# Altium footprint library 6-Connectors-5.PcbLib: 46 footprints (part 1 of 5) (continued)
## 3M_N3408-6202RB [mm] "3M, 3000 Series, 16 Contacts - Pitch 2.54mm - Straight Four-Wall Header (Black) With Short Roll Pin Latch/Ejectors" (continued)
  text "16" at 10.125,1.727 h1.02
  text "1" at -11.227,-2.921 h1.02
3D body "3M_N3408-6202RB.stp": height 24.64, standoff -3.94, extent -19.812,-4.318 19.812,4.318

## 3M_N3408-6302RB [mm] "3M, 3000 Series, 16 Contacts - Pitch 2.54mm - Straight Four-Wall Header (Black) With Long Roll Pin Latch/Ejectors"
height 27.2
pads (18):
  round 1.6 hole 0.9: 1(-8.89,-1.27) 2(-8.89,1.27) 3(-6.35,-1.27) 4(-6.35,1.27) 5(-3.81,-1.27) 6(-3.81,1.27) 7(-1.27,-1.27) 8(-1.27,1.27) 9(1.27,-1.27) 10(1.27,1.27) 11(3.81,-1.27) 12(3.81,1.27) 13(6.35,-1.27) 14(6.35,1.27) 15(8.89,-1.27) 16(8.89,1.27)
  round 4.6 hole 2.8: MTG1(-17.83,-0.254) MTG2(17.83,-0.254)
Top Overlay:
  lines w0.2: -19.812,-2 -19.812,-4.318 19.812,-4.318 19.812,-2 ; -19.812,1.7 -19.812,4.3 ; -19.812,4.318 19.812,4.318 ; -2.032,-4.318 -2.032,-3.175 ; 2.032,-4.318 2.032,-3.175 ; 19.812,1.7 19.812,4.3 ; -12.827,-3.175 12.827,-3.175 12.827,3.175 -12.827,3.175 -12.827,-3.175 ; -10.16,-3.175 -7.62,-3.175 -8.89,-4.318 -10.16,-3.175
  text "16" at 10.125,1.727 h1.02
  text "1" at -11.227,-2.921 h1.02
Mechanical 8:
  lines w0.1: -18.83,-0.254 -17.83,-0.254 ; -17.83,-1.254 -17.83,-0.254 ; -17.83,0.746 -17.83,-0.254 ; -16.83,-0.254 -17.83,-0.254 ; -9.89,-1.27 -8.89,-1.27 ; -9.89,1.27 -8.89,1.27 ; -8.89,-2.27 -8.89,-1.27 ; -8.89,-0.27 -8.89,-1.27 ; -8.89,0.27 -8.89,1.27 ; -8.89,2.27 -8.89,1.27 ; -7.89,-1.27 -8.89,-1.27 ; -7.89,1.27 -8.89,1.27 ; -7.35,-1.27 -6.35,-1.27 ; -7.35,1.27 -6.35,1.27 ; -6.35,-2.27 -6.35,-1.27 ; -6.35,-0.27 -6.35,-1.27 ; -6.35,0.27 -6.35,1.27 ; -6.35,2.27 -6.35,1.27 ; -5.35,-1.27 -6.35,-1.27 ; -5.35,1.27 -6.35,1.27 ; -4.81,-1.27 -3.81,-1.27 ; -4.81,1.27 -3.81,1.27 ; -3.81,-2.27 -3.81,-1.27 ; -3.81,-0.27 -3.81,-1.27 ; -3.81,0.27 -3.81,1.27 ; -3.81,2.27 -3.81,1.27 ; -2.81,-1.27 -3.81,-1.27 ; -2.81,1.27 -3.81,1.27 ; -2.27,-1.27 -1.27,-1.27 ; -2.27,1.27 -1.27,1.27 ; -1.27,-2.27 -1.27,-1.27 ; -1.27,-0.27 -1.27,-1.27 ; -1.27,0.27 -1.27,1.27 ; -1.27,2.27 -1.27,1.27 ; -1,0 0,0 ; -0.27,-1.27 -1.27,-1.27 ; -0.27,1.27 -1.27,1.27 ; 0,-1 0,0 ; 0,1 0,0 ; 0.27,-1.27 1.27,-1.27 ; 0.27,1.27 1.27,1.27 ; 1,0 0,0 ; 1.27,-2.27 1.27,-1.27 ; 1.27,-0.27 1.27,-1.27 ; 1.27,0.27 1.27,1.27 ; 1.27,2.27 1.27,1.27 ; 2.27,-1.27 1.27,-1.27 ; 2.27,1.27 1.27,1.27 ; 2.81,-1.27 3.81,-1.27 ; 2.81,1.27 3.81,1.27 ; 3.81,-2.27 3.81,-1.27 ; 3.81,-0.27 3.81,-1.27 ; 3.81,0.27 3.81,1.27 ; 3.81,2.27 3.81,1.27 ; 4.81,-1.27 3.81,-1.27 ; 4.81,1.27 3.81,1.27 ; 5.35,-1.27 6.35,-1.27 ; 5.35,1.27 6.35,1.27 ; 6.35,-2.27 6.35,-1.27 ; 6.35,-0.27 6.35,-1.27 ; 6.35,0.27 6.35,1.27 ; 6.35,2.27 6.35,1.27 ; 7.35,-1.27 6.35,-1.27 ; 7.35,1.27 6.35,1.27 ; 7.89,-1.27 8.89,-1.27 ; 7.89,1.27 8.89,1.27 ; 8.89,-2.27 8.89,-1.27 ; 8.89,-0.27 8.89,-1.27 ; 8.89,0.27 8.89,1.27 ; 8.89,2.27 8.89,1.27 ; 9.89,-1.27 8.89,-1.27 ; 9.89,1.27 8.89,1.27 ; 16.844,-0.254 17.844,-0.254 ; 17.844,-1.254 17.844,-0.254 ; 17.844,0.746 17.844,-0.254 ; 18.844,-0.254 17.844,-0.254
Mechanical 14:
  circle w0.1: c17.844,-0.254 r1.27
  circle w0.1: c-17.844,-0.254 r1.27
  lines w0.1: -19.812,-3.175 -16.484,-3.175 ; -16.484,-4.318 -16.484,-1.727 -9.525,-1.727 -9.525,1.27 -16.484,1.27 -16.484,4.318 ; -15.642,-4.318 -15.642,-1.727 ; -15.642,1.27 -15.642,4.318 ; -13.209,-4.318 -13.208,-1.727 ; -12.827,-1.727 -12.827,-3.175 12.827,-3.175 12.827,-1.727 ; -12.827,1.27 -12.827,3.175 12.827,3.175 12.827,1.27 ; -6.039,-4.318 -6.039,-3.175 ; -4.121,-4.318 -4.121,-3.175 ; -2.032,-4.318 -2.032,-3.175 ; 2.032,-4.318 2.032,-3.175 ; 6.661,-4.318 6.661,-3.175 ; 8.579,-4.318 8.579,-3.175 ; 12.366,-4.318 12.366,-3.175 ; 12.366,3.175 12.366,4.318 ; 13.208,1.27 13.208,4.318 ; 13.249,-4.318 13.249,-1.727 ; 15.642,-4.318 15.642,-1.727 ; 15.642,1.27 15.642,4.318 ; 16.484,-4.318 16.484,-1.727 9.525,-1.727 9.525,1.27 16.484,1.27 16.484,4.318 ; 16.484,-3.175 19.812,-3.175 ; 16.484,3.175 19.812,3.175 ; -19.812,-4.318 -19.812,4.318 19.812,4.318 19.812,-4.318 -19.812,-4.318 ; -19.812,3.175 -16.484,3.175 -19.812,3.175 ; -19.368,-1.134 -17.844,-2.014 -16.32,-1.134 -16.32,0.626 -17.844,1.506 -19.368,0.626 -19.368,-1.134 ; -13.208,1.27 -13.208,4.318 -13.208,1.27 ; -12.366,-4.318 -12.366,-3.175 -12.366,-4.318 ; -12.366,3.175 -12.366,4.318 -12.366,3.175 ; 16.32,-1.134 17.844,-2.014 19.368,-1.134 19.368,0.626 17.844,1.506 16.32,0.626 16.32,-1.134
  text "16" at 10.125,1.727 h1.02
  text "1" at -11.227,-2.921 h1.02
3D body "3M_N3408-6302RB.stp": height 27.18, standoff -3.94, extent -19.812,-4.318 19.812,4.318

## 3M_N3428-6202RB [mm] "3M, 3000 Series, 20 Contacts - Pitch 2.54mm - Straight Four-Wall Header (Black) With Short Roll Pin Latch/Ejectors"
height 24.6
pads (22):
  round 1.6 hole 0.9: 1(-11.43,-1.27) 2(-11.43,1.27) 3(-8.89,-1.27) 4(-8.89,1.27) 5(-6.35,-1.27) 6(-6.35,1.27) 7(-3.81,-1.27) 8(-3.81,1.27) 9(-1.27,-1.27) 10(-1.27,1.27) 11(1.27,-1.27) 12(1.27,1.27) 13(3.81,-1.27) 14(3.81,1.27) 15(6.35,-1.27) 16(6.35,1.27) 17(8.89,-1.27) 18(8.89,1.27) 19(11.43,-1.27) 20(11.43,1.27)
  round 4.6 hole 2.8: MTG1(-20.384,-0.254) MTG2(20.384,-0.254)
Top Overlay:
  lines w0.2: -22.352,-2 -22.352,-4.318 22.352,-4.318 22.352,-2 ; -22.352,1.7 -22.352,4.3 ; -22.352,4.318 22.352,4.318 ; -12.7,-3.175 -11.43,-4.318 -10.16,-3.175 ; -2.032,-4.318 -2.032,-3.175 ; 2.032,-4.318 2.032,-3.175 ; 22.352,1.7 22.352,4.3 ; -15.367,-3.175 15.367,-3.175 15.367,3.175 -15.367,3.175 -15.367,-3.175
  text "20" at 12.665,1.727 h1.02
  text "1" at -13.767,-2.871 h1.02
Mechanical 14:
  circle w0.1: c-20.384,-0.254 r1.27
  circle w0.1: c20.384,-0.254 r1.27
  lines w0.1: -22.352,-3.175 -19.024,-3.175 ; -21.384,-0.254 -20.384,-0.254 ; -20.384,-1.254 -20.384,-0.254 ; -20.384,0.746 -20.384,-0.254 ; -19.384,-0.254 -20.384,-0.254 ; -19.024,-4.318 -19.024,-1.727 -12.065,-1.727 -12.065,1.27 -19.024,1.27 -19.024,4.318 ; -18.182,-4.318 -18.182,-1.727 ; -18.182,1.27 -18.182,4.318 ; -15.749,-4.318 -15.748,-1.727 ; -15.367,-1.727 -15.367,-3.175 15.367,-3.175 15.367,-1.727 ; -15.367,1.27 -15.367,3.175 15.367,3.175 15.367,1.27 ; -2.032,-4.318 -2.032,-3.175 ; 2.032,-4.318 2.032,-3.175 ; 14.906,-4.318 14.906,-3.175 ; 14.906,3.175 14.906,4.318 ; 15.748,1.27 15.748,4.318 ; 15.789,-4.318 15.789,-1.727 ; 18.182,-4.318 18.182,-1.727 ; 18.182,1.27 18.182,4.318 ; 19.024,-4.318 19.024,-1.727 12.065,-1.727 12.065,1.27 19.024,1.27 19.024,4.318 ; 19.024,-3.175 22.352,-3.175 ; 19.024,3.175 22.352,3.175 ; 19.384,-0.254 20.384,-0.254 ; 20.384,-1.254 20.384,-0.254 ; 20.384,0.746 20.384,-0.254 ; 21.384,-0.254 20.384,-0.254 ; -22.352,-4.318 22.352,-4.318 22.352,4.318 -22.352,4.318 -22.352,-4.318 ; -22.352,3.175 -19.024,3.175 -22.352,3.175 ; -21.908,-1.134 -21.908,0.626 -20.384,1.506 -18.86,0.626 -18.86,-1.134 -20.384,-2.014 -21.908,-1.134 ; -15.748,1.27 -15.748,4.318 -15.748,1.27 ; -14.906,-4.318 -14.906,-3.175 -14.906,-4.318 ; -14.906,3.175 -14.906,4.318 -14.906,3.175 ; -12.7,-3.175 -11.43,-4.318 -10.16,-3.175 -12.7,-3.175 ; 18.86,-1.134 18.86,0.626 20.384,1.506 21.908,0.626 21.908,-1.134 20.384,-2.014 18.86,-1.134
  text "1" at -13.767,-2.871 h1.02
  text "20" at 12.665,1.727 h1.02
3D body "3M_N3428-6202RB.stp": height 24.64, standoff -3.94, extent -22.352,-4.318 22.352,4.318

## 3M_N3429-6002RB [mm] "3M, 3000 Series, 26 Contacts - Pitch 2.54mm - Straight Four-Wall Header (Black) Without Roll Pin Latch/Ejectors"
height 24.6
pads (28):
  round 1.6 hole 0.9: 1(-15.24,-1.27) 2(-15.24,1.27) 3(-12.7,-1.27) 4(-12.7,1.27) 5(-10.16,-1.27) 6(-10.16,1.27) 7(-7.62,-1.27) 8(-7.62,1.27) 9(-5.08,-1.27) 10(-5.08,1.27) 11(-2.54,-1.27) 12(-2.54,1.27) 13(0,-1.27) 14(0,1.27) 15(2.54,-1.27) 16(2.54,1.27) 17(5.08,-1.27) 18(5.08,1.27) 19(7.62,-1.27) 20(7.62,1.27) 21(10.16,-1.27) 22(10.16,1.27) 23(12.7,-1.27) 24(12.7,1.27) 25(15.24,-1.27) 26(15.24,1.27)
  round 4.6 hole 2.8: MTG1(-24.18,-0.25) MTG2(24.18,-0.25)
Top Overlay:
  lines w0.2: -26.162,-2 -26.162,-4.318 26.162,-4.318 26.162,-2 ; -26.162,1.7 -26.162,4.3 ; -26.162,4.318 26.162,4.318 ; -2.032,-4.318 -2.032,-3.175 ; 2.032,-4.318 2.032,-3.175 ; 26.162,1.7 26.162,4.3 ; -19.177,-3.175 -19.177,3.175 19.177,3.175 19.177,-3.175 -19.177,-3.175 ; -16.51,-3.175 -15.24,-4.318 -13.97,-3.175 -16.51,-3.175
  text "1" at -17.577,-2.921 h1.02
  text "26" at 16.475,1.727 h1.02
Mechanical 8:
  lines w0.1: -24.68,-0.25 -24.18,-0.25 ; -24.18,-0.75 -24.18,-0.25 ; -24.18,0.25 -24.18,-0.25 ; -23.68,-0.25 -24.18,-0.25 ; -15.74,-1.27 -15.24,-1.27 ; -15.74,1.27 -15.24,1.27 ; -15.24,-1.77 -15.24,-1.27 ; -15.24,-0.77 -15.24,-1.27 ; -15.24,0.77 -15.24,1.27 ; -15.24,1.77 -15.24,1.27 ; -14.74,-1.27 -15.24,-1.27 ; -14.74,1.27 -15.24,1.27 ; -13.2,-1.27 -12.7,-1.27 ; -13.2,1.27 -12.7,1.27 ; -12.7,-1.77 -12.7,-1.27 ; -12.7,-0.77 -12.7,-1.27 ; -12.7,0.77 -12.7,1.27 ; -12.7,1.77 -12.7,1.27 ; -12.2,-1.27 -12.7,-1.27 ; -12.2,1.27 -12.7,1.27 ; -10.66,-1.27 -10.16,-1.27 ; -10.66,1.27 -10.16,1.27 ; -10.16,-1.77 -10.16,-1.27 ; -10.16,-0.77 -10.16,-1.27 ; -10.16,0.77 -10.16,1.27 ; -10.16,1.77 -10.16,1.27 ; -9.66,-1.27 -10.16,-1.27 ; -9.66,1.27 -10.16,1.27 ; -8.12,-1.27 -7.62,-1.27 ; -8.12,1.27 -7.62,1.27 ; -7.62,-1.77 -7.62,-1.27 ; -7.62,-0.77 -7.62,-1.27 ; -7.62,0.77 -7.62,1.27 ; -7.62,1.77 -7.62,1.27 ; -7.12,-1.27 -7.62,-1.27 ; -7.12,1.27 -7.62,1.27 ; -5.58,-1.27 -5.08,-1.27 ; -5.58,1.27 -5.08,1.27 ; -5.08,-1.77 -5.08,-1.27 ; -5.08,-0.77 -5.08,-1.27 ; -5.08,0.77 -5.08,1.27 ; -5.08,1.77 -5.08,1.27 ; -4.58,-1.27 -5.08,-1.27 ; -4.58,1.27 -5.08,1.27 ; -3.04,-1.27 -2.54,-1.27 ; -3.04,1.27 -2.54,1.27 ; -2.54,-1.77 -2.54,-1.27 ; -2.54,-0.77 -2.54,-1.27 ; -2.54,0.77 -2.54,1.27 ; -2.54,1.77 -2.54,1.27 ; -2.04,-1.27 -2.54,-1.27 ; -2.04,1.27 -2.54,1.27 ; -0.5,-1.27 0,-1.27 ; -0.5,0 0,0 ; -0.5,1.27 0,1.27 ; 0,-1.77 0,-1.27 ; 0,-0.77 0,-1.27 ; 0,-0.5 0,0 ; 0,0.5 0,0 ; 0,0.77 0,1.27 ; 0,1.77 0,1.27 ; 0.5,-1.27 0,-1.27 ; 0.5,0 0,0 ; 0.5,1.27 0,1.27 ; 2.04,-1.27 2.54,-1.27 ; 2.04,1.27 2.54,1.27 ; 2.54,-1.77 2.54,-1.27 ; 2.54,-0.77 2.54,-1.27 ; 2.54,0.77 2.54,1.27 ; 2.54,1.77 2.54,1.27 ; 3.04,-1.27 2.54,-1.27 ; 3.04,1.27 2.54,1.27 ; 4.58,-1.27 5.08,-1.27 ; 4.58,1.27 5.08,1.27 ; 5.08,-1.77 5.08,-1.27 ; 5.08,-0.77 5.08,-1.27 ; 5.08,0.77 5.08,1.27 ; 5.08,1.77 5.08,1.27 ; 5.58,-1.27 5.08,-1.27 ; 5.58,1.27 5.08,1.27 ; 7.12,-1.27 7.62,-1.27 ; 7.12,1.27 7.62,1.27 ; 7.62,-1.77 7.62,-1.27 ; 7.62,-0.77 7.62,-1.27 ; 7.62,0.77 7.62,1.27 ; 7.62,1.77 7.62,1.27 ; 8.12,-1.27 7.62,-1.27 ; 8.12,1.27 7.62,1.27 ; 9.66,-1.27 10.16,-1.27 ; 9.66,1.27 10.16,1.27 ; 10.16,-1.77 10.16,-1.27 ; 10.16,-0.77 10.16,-1.27 ; 10.16,0.77 10.16,1.27 ; 10.16,1.77 10.16,1.27 ; 10.66,-1.27 10.16,-1.27 ; 10.66,1.27 10.16,1.27 ; 12.2,-1.27 12.7,-1.27 ; 12.2,1.27 12.7,1.27 ; 12.7,-1.77 12.7,-1.27 ; 12.7,-0.77 12.7,-1.27 ; 12.7,0.77 12.7,1.27 ; 12.7,1.77 12.7,1.27 ; 13.2,-1.27 12.7,-1.27 ; 13.2,1.27 12.7,1.27 ; 14.74,-1.27 15.24,-1.27 ; 14.74,1.27 15.24,1.27 ; 15.24,-1.77 15.24,-1.27 ; 15.24,-0.77 15.24,-1.27 ; 15.24,0.77 15.24,1.27 ; 15.24,1.77 15.24,1.27 ; 15.74,-1.27 15.24,-1.27 ; 15.74,1.27 15.24,1.27 ; 23.68,-0.25 24.18,-0.25 ; 24.18,-0.75 24.18,-0.25 ; 24.18,0.25 24.18,-0.25 ; 24.68,-0.25 24.18,-0.25
Mechanical 14:
  circle w0.1: c-24.194,-0.254 r1.27
  circle w0.1: c24.194,-0.254 r1.27
  lines w0.1: -26.162,-3.175 -22.834,-3.175 ; -22.834,-4.318 -22.834,-1.727 -15.875,-1.727 -15.875,1.27 -22.834,1.27 -22.834,4.318 ; -21.992,-4.318 -21.992,-1.727 ; -21.992,1.27 -21.992,4.318 ; -19.559,-4.318 -19.558,-1.727 ; -19.177,-1.727 -19.177,-3.175 19.177,-3.175 19.177,-1.727 ; -19.177,1.27 -19.177,3.175 19.177,3.175 19.177,1.27 ; -12.389,-4.318 -12.389,-3.175 ; -10.471,-4.318 -10.471,-3.175 ; 18.716,-4.318 18.716,-3.175 ; 18.716,3.175 18.716,4.318 ; 19.558,1.27 19.558,4.318 ; 19.599,-4.318 19.599,-1.727 ; 21.992,-4.318 21.992,-1.727 ; 21.992,1.27 21.992,4.318 ; 22.834,-4.318 22.834,-1.727 15.875,-1.727 15.875,1.27 22.834,1.27 22.834,4.318 ; 22.834,-3.175 26.162,-3.175 ; 22.834,3.175 26.162,3.175 ; -26.162,-4.318 26.162,-4.318 26.162,4.318 -26.162,4.318 -26.162,-4.318 ; -26.162,3.175 -22.834,3.175 -26.162,3.175 ; -25.718,-1.134 -25.718,0.626 -24.194,1.506 -22.67,0.626 -22.67,-1.134 -24.194,-2.014 -25.718,-1.134 ; -19.558,1.27 -19.558,4.318 -19.558,1.27 ; -18.716,-4.318 -18.716,-3.175 -18.716,-4.318 ; -18.716,3.175 -18.716,4.318 -18.716,3.175 ; -16.51,-3.175 -15.24,-4.318 -13.97,-3.175 -16.51,-3.175 ; 22.67,-1.134 22.67,0.626 24.194,1.506 25.718,0.626 25.718,-1.134 24.194,-2.014 22.67,-1.134
  text "1" at -17.577,-2.921 h1.02
  text "26" at 16.475,1.727 h1.02
3D body "3M_N3429-6002RB.stp": height 17.27, standoff -3.94, extent -26.162,-4.318 26.162,4.318

## 3M_N3429-6202RB [mm] "3M, 3000 Series, 26 Contacts - Pitch 2.54mm - Straight Four-Wall Header (Black) With Short Roll Pin Latch/Ejectors"
height 24.6
pads (28):
  round 1.6 hole 0.9: 1(-15.24,-1.27) 2(-15.24,1.27) 3(-12.7,-1.27) 4(-12.7,1.27) 5(-10.16,-1.27) 6(-10.16,1.27) 7(-7.62,-1.27) 8(-7.62,1.27) 9(-5.08,-1.27) 10(-5.08,1.27) 11(-2.54,-1.27) 12(-2.54,1.27) 13(0,-1.27) 14(0,1.27) 15(2.54,-1.27) 16(2.54,1.27) 17(5.08,-1.27) 18(5.08,1.27) 19(7.62,-1.27) 20(7.62,1.27) 21(10.16,-1.27) 22(10.16,1.27) 23(12.7,-1.27) 24(12.7,1.27) 25(15.24,-1.27) 26(15.24,1.27)
  round 4.6 hole 2.8: MTG1(-24.18,-0.25) MTG2(24.18,-0.25)
Top Overlay:
  lines w0.2: -26.162,-2 -26.162,-4.318 26.162,-4.318 26.162,-2 ; -26.162,1.7 -26.162,4.3 ; -26.162,4.318 26.162,4.318 ; -2.032,-4.318 -2.032,-3.175 ; 2.032,-4.318 2.032,-3.175 ; 26.162,1.7 26.162,4.3 ; -19.177,-3.175 19.177,-3.175 19.177,3.175 -19.177,3.175 -19.177,-3.175 ; -16.51,-3.175 -13.97,-3.175 -15.24,-4.318 -16.51,-3.175
  text "26" at 16.475,1.727 h1.02
  text "1" at -17.577,-2.921 h1.02
Mechanical 8:
  lines w0.1: -24.68,-0.25 -24.18,-0.25 ; -24.18,-0.75 -24.18,-0.25 ; -24.18,0.25 -24.18,-0.25 ; -23.68,-0.25 -24.18,-0.25 ; -15.74,-1.27 -15.24,-1.27 ; -15.74,1.27 -15.24,1.27 ; -15.24,-1.77 -15.24,-1.27 ; -15.24,-0.77 -15.24,-1.27 ; -15.24,0.77 -15.24,1.27 ; -15.24,1.77 -15.24,1.27 ; -14.74,-1.27 -15.24,-1.27 ; -14.74,1.27 -15.24,1.27 ; -13.2,-1.27 -12.7,-1.27 ; -13.2,1.27 -12.7,1.27 ; -12.7,-1.77 -12.7,-1.27 ; -12.7,-0.77 -12.7,-1.27 ; -12.7,0.77 -12.7,1.27 ; -12.7,1.77 -12.7,1.27 ; -12.2,-1.27 -12.7,-1.27 ; -12.2,1.27 -12.7,1.27 ; -10.66,-1.27 -10.16,-1.27 ; -10.66,1.27 -10.16,1.27 ; -10.16,-1.77 -10.16,-1.27 ; -10.16,-0.77 -10.16,-1.27 ; -10.16,0.77 -10.16,1.27 ; -10.16,1.77 -10.16,1.27 ; -9.66,-1.27 -10.16,-1.27 ; -9.66,1.27 -10.16,1.27 ; -8.12,-1.27 -7.62,-1.27 ; -8.12,1.27 -7.62,1.27 ; -7.62,-1.77 -7.62,-1.27 ; -7.62,-0.77 -7.62,-1.27 ; -7.62,0.77 -7.62,1.27 ; -7.62,1.77 -7.62,1.27 ; -7.12,-1.27 -7.62,-1.27 ; -7.12,1.27 -7.62,1.27 ; -5.58,-1.27 -5.08,-1.27 ; -5.58,1.27 -5.08,1.27 ; -5.08,-1.77 -5.08,-1.27 ; -5.08,-0.77 -5.08,-1.27 ; -5.08,0.77 -5.08,1.27 ; -5.08,1.77 -5.08,1.27 ; -4.58,-1.27 -5.08,-1.27 ; -4.58,1.27 -5.08,1.27 ; -3.04,-1.27 -2.54,-1.27 ; -3.04,1.27 -2.54,1.27 ; -2.54,-1.77 -2.54,-1.27 ; -2.54,-0.77 -2.54,-1.27 ; -2.54,0.77 -2.54,1.27 ; -2.54,1.77 -2.54,1.27 ; -2.04,-1.27 -2.54,-1.27 ; -2.04,1.27 -2.54,1.27 ; -0.5,-1.27 0,-1.27 ; -0.5,0 0,0 ; -0.5,1.27 0,1.27 ; 0,-1.77 0,-1.27 ; 0,-0.77 0,-1.27 ; 0,-0.5 0,0 ; 0,0.5 0,0 ; 0,0.77 0,1.27 ; 0,1.77 0,1.27 ; 0.5,-1.27 0,-1.27 ; 0.5,0 0,0 ; 0.5,1.27 0,1.27 ; 2.04,-1.27 2.54,-1.27 ; 2.04,1.27 2.54,1.27 ; 2.54,-1.77 2.54,-1.27 ; 2.54,-0.77 2.54,-1.27 ; 2.54,0.77 2.54,1.27 ; 2.54,1.77 2.54,1.27 ; 3.04,-1.27 2.54,-1.27 ; 3.04,1.27 2.54,1.27 ; 4.58,-1.27 5.08,-1.27 ; 4.58,1.27 5.08,1.27 ; 5.08,-1.77 5.08,-1.27 ; 5.08,-0.77 5.08,-1.27 ; 5.08,0.77 5.08,1.27 ; 5.08,1.77 5.08,1.27 ; 5.58,-1.27 5.08,-1.27 ; 5.58,1.27 5.08,1.27 ; 7.12,-1.27 7.62,-1.27 ; 7.12,1.27 7.62,1.27 ; 7.62,-1.77 7.62,-1.27 ; 7.62,-0.77 7.62,-1.27 ; 7.62,0.77 7.62,1.27 ; 7.62,1.77 7.62,1.27 ; 8.12,-1.27 7.62,-1.27 ; 8.12,1.27 7.62,1.27 ; 9.66,-1.27 10.16,-1.27 ; 9.66,1.27 10.16,1.27 ; 10.16,-1.77 10.16,-1.27 ; 10.16,-0.77 10.16,-1.27 ; 10.16,0.77 10.16,1.27 ; 10.16,1.77 10.16,1.27 ; 10.66,-1.27 10.16,-1.27 ; 10.66,1.27 10.16,1.27 ; 12.2,-1.27 12.7,-1.27 ; 12.2,1.27 12.7,1.27 ; 12.7,-1.77 12.7,-1.27 ; 12.7,-0.77 12.7,-1.27 ; 12.7,0.77 12.7,1.27 ; 12.7,1.77 12.7,1.27 ; 13.2,-1.27 12.7,-1.27 ; 13.2,1.27 12.7,1.27 ; 14.74,-1.27 15.24,-1.27 ; 14.74,1.27 15.24,1.27 ; 15.24,-1.77 15.24,-1.27 ; 15.24,-0.77 15.24,-1.27 ; 15.24,0.77 15.24,1.27 ; 15.24,1.77 15.24,1.27 ; 15.74,-1.27 15.24,-1.27 ; 15.74,1.27 15.24,1.27 ; 23.68,-0.25 24.18,-0.25 ; 24.18,-0.75 24.18,-0.25 ; 24.18,0.25 24.18,-0.25 ; 24.68,-0.25 24.18,-0.25
Mechanical 14:
  circle w0.1: c24.194,-0.254 r1.27
  circle w0.1: c-24.194,-0.254 r1.27
  lines w0.1: -26.162,-3.175 -22.834,-3.175 ; -22.834,-4.318 -22.834,-1.727 -15.875,-1.727 -15.875,1.27 -22.834,1.27 -22.834,4.318 ; -21.992,-4.318 -21.992,-1.727 ; -21.992,1.27 -21.992,4.318 ; -19.559,-4.318 -19.558,-1.727 ; -19.177,-1.727 -19.177,-3.175 19.177,-3.175 19.177,-1.727 ; -19.177,1.27 -19.177,3.175 19.177,3.175 19.177,1.27 ; -12.389,-4.318 -12.389,-3.175 ; -10.471,-4.318 -10.471,-3.175 ; 18.716,-4.318 18.716,-3.175 ; 18.716,3.175 18.716,4.318 ; 19.558,1.27 19.558,4.318 ; 19.599,-4.318 19.599,-1.727 ; 21.992,-4.318 21.992,-1.727 ; 21.992,1.27 21.992,4.318 ; 22.834,-4.318 22.834,-1.727 15.875,-1.727 15.875,1.27 22.834,1.27 22.834,4.318 ; 22.834,-3.175 26.162,-3.175 ; 22.834,3.175 26.162,3.175 ; -26.162,-4.318 -26.162,4.318 26.162,4.318 26.162,-4.318 -26.162,-4.318 ; -26.162,3.175 -22.834,3.175 -26.162,3.175 ; -25.718,-1.134 -24.194,-2.014 -22.67,-1.134 -22.67,0.626 -24.194,1.506 -25.718,0.626 -25.718,-1.134 ; -19.558,1.27 -19.558,4.318 -19.558,1.27 ; -18.716,-4.318 -18.716,-3.175 -18.716,-4.318 ; -18.716,3.175 -18.716,4.318 -18.716,3.175 ; -16.51,-3.175 -13.97,-3.175 -15.24,-4.318 -16.51,-3.175 ; 22.67,-1.134 24.194,-2.014 25.718,-1.134 25.718,0.626 24.194,1.506 22.67,0.626 22.67,-1.134
  text "26" at 16.475,1.727 h1.02
  text "1" at -17.577,-2.921 h1.02
3D body "3M_N3429-6202RB.stp": height 24.64, standoff -3.94, extent -26.162,-4.318 26.162,4.318

## 3M_N3431-6202RB [mm] "3M, 3000 Series, 34 Contacts - Pitch 2.54mm - Straight Four-Wall Header (Black) With Short Roll Pin Latch/Ejectors"
height 24.6
pads (36):
  round 1.6 hole 0.9: 1(-20.32,-1.27) 2(-20.32,1.27) 3(-17.78,-1.27) 4(-17.78,1.27) 5(-15.24,-1.27) 6(-15.24,1.27) 7(-12.7,-1.27) 8(-12.7,1.27) 9(-10.16,-1.27) 10(-10.16,1.27) 11(-7.62,-1.27) 12(-7.62,1.27) 13(-5.08,-1.27) 14(-5.08,1.27) 15(-2.54,-1.27) 16(-2.54,1.27) 17(0,-1.27) 18(0,1.27) 19(2.54,-1.27) 20(2.54,1.27) 21(5.08,-1.27) 22(5.08,1.27) 23(7.62,-1.27) 24(7.62,1.27) 25(10.16,-1.27) 26(10.16,1.27) 27(12.7,-1.27) 28(12.7,1.27) 29(15.24,-1.27) 30(15.24,1.27) 31(17.78,-1.27) 32(17.78,1.27) 33(20.32,-1.27) 34(20.32,1.27)
  round 4.6 hole 2.8: MTG1(-29.274,-0.254) MTG2(29.274,-0.254)
Top Overlay:
  lines w0.2: -31.242,-2 -31.242,-4.318 31.242,-4.318 31.242,-2 ; -31.242,1.7 -31.242,4.3 ; -31.242,4.318 31.242,4.318 ; -2.032,-4.318 -2.032,-3.175 ; 2.032,-4.318 2.032,-3.175 ; 31.242,1.7 31.242,4.3 ; -24.257,-3.175 24.257,-3.175 24.257,3.175 -24.257,3.175 -24.257,-3.175 ; -21.59,-3.175 -20.32,-4.318 -19.05,-3.175 -21.59,-3.175
  text "34" at 21.555,1.727 h1.02
  text "1" at -22.657,-2.921 h1.02
Mechanical 8:
  lines w0.1: -21.32,-1.27 -20.32,-1.27 ; -21.32,1.27 -20.32,1.27 ; -20.32,-2.27 -20.32,-1.27 ; -20.32,-0.27 -20.32,-1.27 ; -20.32,0.27 -20.32,1.27 ; -20.32,2.27 -20.32,1.27 ; -19.32,-1.27 -20.32,-1.27 ; -19.32,1.27 -20.32,1.27 ; -18.78,-1.27 -17.78,-1.27 ; -18.78,1.27 -17.78,1.27 ; -17.78,-2.27 -17.78,-1.27 ; -17.78,-0.27 -17.78,-1.27 ; -17.78,0.27 -17.78,1.27 ; -17.78,2.27 -17.78,1.27 ; -16.78,-1.27 -17.78,-1.27 ; -16.78,1.27 -17.78,1.27 ; -16.24,-1.27 -15.24,-1.27 ; -16.24,1.27 -15.24,1.27 ; -15.24,-2.27 -15.24,-1.27 ; -15.24,-0.27 -15.24,-1.27 ; -15.24,0.27 -15.24,1.27 ; -15.24,2.27 -15.24,1.27 ; -14.24,-1.27 -15.24,-1.27 ; -14.24,1.27 -15.24,1.27 ; -13.7,-1.27 -12.7,-1.27 ; -13.7,1.27 -12.7,1.27 ; -12.7,-2.27 -12.7,-1.27 ; -12.7,-0.27 -12.7,-1.27 ; -12.7,0.27 -12.7,1.27 ; -12.7,2.27 -12.7,1.27 ; -11.7,-1.27 -12.7,-1.27 ; -11.7,1.27 -12.7,1.27 ; -11.16,-1.27 -10.16,-1.27 ; -11.16,1.27 -10.16,1.27 ; -10.16,-2.27 -10.16,-1.27 ; -10.16,-0.27 -10.16,-1.27 ; -10.16,0.27 -10.16,1.27 ; -10.16,2.27 -10.16,1.27 ; -9.16,-1.27 -10.16,-1.27 ; -9.16,1.27 -10.16,1.27 ; -8.62,-1.27 -7.62,-1.27 ; -8.62,1.27 -7.62,1.27 ; -7.62,-2.27 -7.62,-1.27 ; -7.62,-0.27 -7.62,-1.27 ; -7.62,0.27 -7.62,1.27 ; -7.62,2.27 -7.62,1.27 ; -6.62,-1.27 -7.62,-1.27 ; -6.62,1.27 -7.62,1.27 ; -6.08,-1.27 -5.08,-1.27 ; -6.08,1.27 -5.08,1.27 ; -5.08,-2.27 -5.08,-1.27 ; -5.08,-0.27 -5.08,-1.27 ; -5.08,0.27 -5.08,1.27 ; -5.08,2.27 -5.08,1.27 ; -4.08,-1.27 -5.08,-1.27 ; -4.08,1.27 -5.08,1.27 ; -3.54,-1.27 -2.54,-1.27 ; -3.54,1.27 -2.54,1.27 ; -2.54,-2.27 -2.54,-1.27 ; -2.54,-0.27 -2.54,-1.27 ; -2.54,0.27 -2.54,1.27 ; -2.54,2.27 -2.54,1.27 ; -1.54,-1.27 -2.54,-1.27 ; -1.54,1.27 -2.54,1.27 ; -1,-1.27 0,-1.27 ; -1,0 0,0 ; -1,1.27 0,1.27 ; 0,-2.27 0,-1.27 ; 0,-1 0,0 ; 0,-0.27 0,-1.27 ; 0,0.27 0,1.27 ; 0,1 0,0 ; 0,2.27 0,1.27 ; 1,-1.27 0,-1.27 ; 1,0 0,0 ; 1,1.27 0,1.27 ; 1.54,-1.27 2.54,-1.27 ; 1.54,1.27 2.54,1.27 ; 2.54,-2.27 2.54,-1.27 ; 2.54,-0.27 2.54,-1.27 ; 2.54,0.27 2.54,1.27 ; 2.54,2.27 2.54,1.27 ; 3.54,-1.27 2.54,-1.27 ; 3.54,1.27 2.54,1.27 ; 4.08,-1.27 5.08,-1.27 ; 4.08,1.27 5.08,1.27 ; 5.08,-2.27 5.08,-1.27 ; 5.08,-0.27 5.08,-1.27 ; 5.08,0.27 5.08,1.27 ; 5.08,2.27 5.08,1.27 ; 6.08,-1.27 5.08,-1.27 ; 6.08,1.27 5.08,1.27 ; 6.62,-1.27 7.62,-1.27 ; 6.62,1.27 7.62,1.27 ; 7.62,-2.27 7.62,-1.27 ; 7.62,-0.27 7.62,-1.27 ; 7.62,0.27 7.62,1.27 ; 7.62,2.27 7.62,1.27 ; 8.62,-1.27 7.62,-1.27 ; 8.62,1.27 7.62,1.27 ; 9.16,-1.27 10.16,-1.27 ; 9.16,1.27 10.16,1.27 ; 10.16,-2.27 10.16,-1.27 ; 10.16,-0.27 10.16,-1.27 ; 10.16,0.27 10.16,1.27 ; 10.16,2.27 10.16,1.27 ; 11.16,-1.27 10.16,-1.27 ; 11.16,1.27 10.16,1.27 ; 11.7,-1.27 12.7,-1.27 ; 11.7,1.27 12.7,1.27 ; 12.7,-2.27 12.7,-1.27 ; 12.7,-0.27 12.7,-1.27 ; 12.7,0.27 12.7,1.27 ; 12.7,2.27 12.7,1.27 ; 13.7,-1.27 12.7,-1.27 ; 13.7,1.27 12.7,1.27 ; 14.24,-1.27 15.24,-1.27 ; 14.24,1.27 15.24,1.27 ; 15.24,-2.27 15.24,-1.27 ; 15.24,-0.27 15.24,-1.27 ; 15.24,0.27 15.24,1.27 ; 15.24,2.27 15.24,1.27 ; 16.24,-1.27 15.24,-1.27 ; 16.24,1.27 15.24,1.27 ; 16.78,-1.27 17.78,-1.27 ; 16.78,1.27 17.78,1.27 ; 17.78,-2.27 17.78,-1.27 ; 17.78,-0.27 17.78,-1.27 ; 17.78,0.27 17.78,1.27 ; 17.78,2.27 17.78,1.27 ; 18.78,-1.27 17.78,-1.27 ; 18.78,1.27 17.78,1.27 ; 19.32,-1.27 20.32,-1.27 ; 19.32,1.27 20.32,1.27 ; 20.32,-2.27 20.32,-1.27 ; 20.32,-0.27 20.32,-1.27 ; 20.32,0.27 20.32,1.27 ; 20.32,2.27 20.32,1.27 ; 21.32,-1.27 20.32,-1.27 ; 21.32,1.27 20.32,1.27
Mechanical 14:
  circle w0.1: c29.274,-0.254 r1.27
  circle w0.1: c-29.274,-0.254 r1.27
  lines w0.1: -31.242,-3.175 -27.914,-3.175 ; -30.274,-0.254 -29.274,-0.254 ; -29.274,-1.254 -29.274,-0.254 ; -29.274,0.746 -29.274,-0.254 ; -28.274,-0.254 -29.274,-0.254 ; -27.914,-4.318 -27.914,-1.727 -20.955,-1.727 -20.955,1.27 -27.914,1.27 -27.914,4.318 ; -27.072,-4.318 -27.072,-1.727 ; -27.072,1.27 -27.072,4.318 ; -24.639,-4.318 -24.638,-1.727 ; -24.257,-1.727 -24.257,-3.175 24.257,-3.175 24.257,-1.727 ; -24.257,1.27 -24.257,3.175 24.257,3.175 24.257,1.27 ; -17.469,-4.318 -17.469,-3.175 ; -15.551,-4.318 -15.551,-3.175 ; -2.032,-4.318 -2.032,-3.175 ; 2.032,-4.318 2.032,-3.175 ; 18.091,-4.318 18.091,-3.175 ; 20.009,-4.318 20.009,-3.175 ; 23.796,-4.318 23.796,-3.175 ; 23.796,3.175 23.796,4.318 ; 24.638,1.27 24.638,4.318 ; 24.679,-4.318 24.679,-1.727 ; 27.072,-4.318 27.072,-1.727 ; 27.072,1.27 27.072,4.318 ; 27.914,-4.318 27.914,-1.727 20.955,-1.727 20.955,1.27 27.914,1.27 27.914,4.318 ; 27.914,-3.175 31.242,-3.175 ; 27.914,3.175 31.242,3.175 ; 28.274,-0.254 29.274,-0.254 ; 29.274,-1.254 29.274,-0.254 ; 29.274,0.746 29.274,-0.254 ; 30.274,-0.254 29.274,-0.254 ; -31.242,-4.318 31.242,-4.318 31.242,4.318 -31.242,4.318 -31.242,-4.318 ; -31.242,3.175 -27.914,3.175 -31.242,3.175 ; -30.798,-1.134 -30.798,0.626 -29.274,1.506 -27.75,0.626 -27.75,-1.134 -29.274,-2.014 -30.798,-1.134 ; -24.638,1.27 -24.638,4.318 -24.638,1.27 ; -23.796,-4.318 -23.796,-3.175 -23.796,-4.318 ; -23.796,3.175 -23.796,4.318 -23.796,3.175 ; -21.59,-3.175 -20.32,-4.318 -19.05,-3.175 -21.59,-3.175 ; 27.75,-1.134 27.75,0.626 29.274,1.506 30.798,0.626 30.798,-1.134 29.274,-2.014 27.75,-1.134
  text "34" at 21.555,1.727 h1.02
  text "1" at -22.657,-2.921 h1.02
3D body "3M_N3431-6202RB.stp": height 24.64, standoff -3.94, extent -31.242,-4.318 31.242,4.318